# Altium footprint library UWB_CAN_R2.PcbLib: 83 footprints (part 6 of 6)
Each footprint in its own frame and in the unit in brackets; x right, y up, seen from the top. Pads: shape width x height; smd on the part's side, far side on the other; paste and mask are expansions set on the pad; w line width, h text height; cw(c..) or ccw(c..) is an arc to the next point about the centre after c.
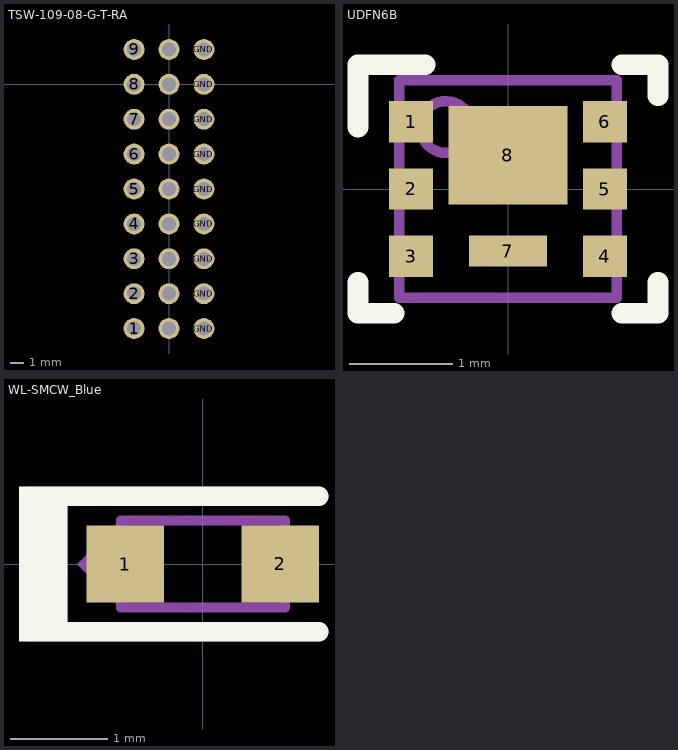
[diagram p5: the footprints below, top view; thin cyan lines are the x and y axes]

## TSW-109-08-G-T-RA [mil] "9 pin head"
pads (27):
  round 60 / inner round 0 / far side round 74.02 hole 40.16: 1(-100,-700) 2(-100,-600) 3(-100,-500) 4(-100,-400) 5(-100,-300) 6(-100,-200) 7(-100,-100) 8(-100,0) 9(-100,100) GND(100,-700) GND(100,-600) GND(100,-500) GND(100,-400) GND(100,-300) GND(100,-200) GND(100,-100) GND(100,0) GND(100,100) "RX 5V"(0,100) "SERVO VCC"(0,-700) "SERVO VCC"(0,-600) "SERVO VCC"(0,-500) "SERVO VCC"(0,-400) "SERVO VCC"(0,-300) "SERVO VCC"(0,-200) "SERVO VCC"(0,-100) "SERVO VCC"(0,0)
3D body "Samtec-TSW-109-08-G-T-RA.STEP": height 330, standoff -80, extent -490,-750 112.5,150

## UDFN6B [mm] "SMD, 6-Leads, Body 2x2mm, Pitch 0.65mm"
height 0.8
pads (8):
  rect 0.425x0.4 smd: 1(-0.938,0.65) 2(-0.937,0) 3(-0.938,-0.65) 4(0.937,-0.65) 5(0.937,0) 6(0.937,0.65)
  rect 0.75x0.3 smd: 7(0,-0.6)
  rect 1.15x0.95 smd: 8(0,0.325)
Top Overlay:
  lines w0.2: -1.45,-0.9 -1.45,-1.2 -1.1,-1.2 ; -1.45,0.6 -1.45,1.2 -0.8,1.2 ; 1.1,-1.2 1.45,-1.2 1.45,-0.9 ; 1.1,1.2 1.45,1.2 1.45,0.9
Mechanical 5:
  circle w0.1: c-0.6,0.6 r0.25
  lines w0.1: -1.05,-1.05 -1.05,1.05 1.05,1.05 1.05,-1.05 -1.05,-1.05
  text ".Designator" at -0.9,-0.2 h0.5
3D body: height 0.8, standoff 0, extent -1.05,-1.05 1.05,1.05
3D body: height 0.8, standoff 0.8, extent -0.849,0.351 -0.351,0.85

## WL-SMCW_Blue [mm] "SMD, 2-Leads, Body 1.6x0.8mm"
height 0.8
pads (2):
  rect 0.8x0.8 smd: 1(-0.8,0) 2(0.8,0)
Top Overlay:
  rectangle: -1.9,-0.8 -1.4,0.8
  lines w0.2: -1.6,-0.7 1.2,-0.7 ; -1.6,0.7 1.2,0.7
Mechanical 5:
  region: -0.9,-0.4 -0.9,0.4 -1.3,0
  lines w0.1: -0.85,-0.45 0.85,-0.45 0.85,0.45 -0.85,0.45 -0.85,-0.45
  lines w0.2: -1.65,-0.7 -1.65,0.55 ; 1.2,-0.7 -1.5,-0.7 ; 1.2,0.7 -1.5,0.7 ; -1.5,-0.7 -1.8,-0.7 -1.8,0.7 -1.5,0.7 ; -1.5,-0.7 -1.5,0.7
3D body: height 0.8, standoff 0.35, extent -0.599,-0.45 0.599,0.45
3D body: height 0.35, standoff 0, extent -0.599,-0.45 0.599,0.45
3D body: height 0.36, standoff 0.35, extent -0.599,-0.45 0.599,0.45
3D body: height 0.35, standoff 0, extent 0.6,-0.449 0.849,0.45
3D body: height 0.35, standoff 0, extent -0.85,-0.449 -0.6,0.45